# Altium footprint library domino-rising-cage-clamp.PcbLib: 435 footprints (part 28 of 28)
Each footprint in its own frame and in the unit in brackets; x right, y up, seen from the top. Pads: shape width x height; smd on the part's side, far side on the other; paste and mask are expansions set on the pad; w line width, h text height; cw(c..) or ccw(c..) is an arc to the next point about the centre after c.
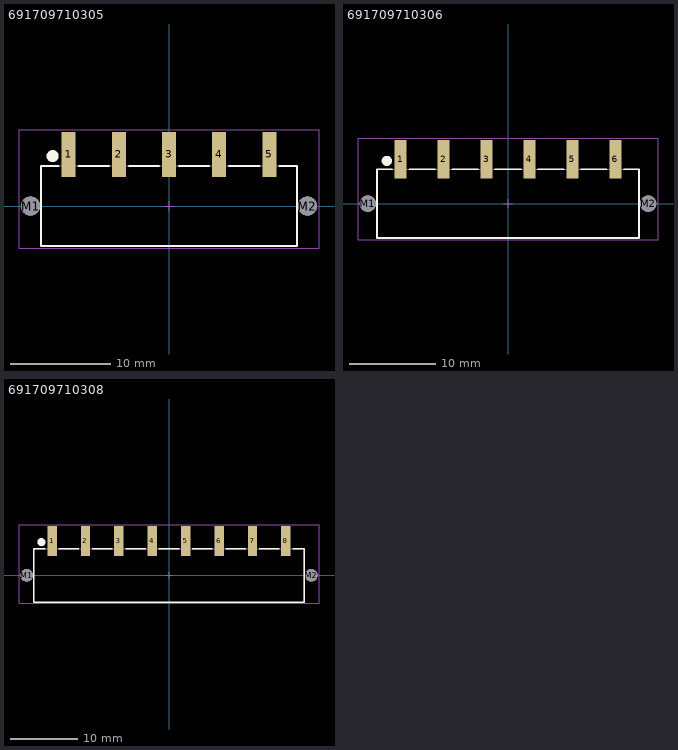
[diagram p27: the footprints below, top view; thin cyan lines are the x and y axes]

## 691709710305 [mm] "Horizontal Entry SMT with Pressure Clamp, pitch 5mm, 05p"
height 10.9
pads (7):
  rect 1.4x4.5 smd: 1(-10,5.15) 2(-5,5.15) 3(0,5.15) 4(5,5.15) 5(10,5.15)
  round 1.9 hole 1.9 unplated: M1(-13.8,0) M2(13.8,0)
Top Overlay:
  circle w0.8: c-11.6,4.975 r0.193
  lines w0.2: -11,4 -12.75,4 -12.75,-4 12.75,-4 12.75,4 11,4 ; -9,4 -6,4 ; -4,4 -1,4 ; 1,4 4,4 ; 6,4 9,4
Mechanical 13:
  lines w0.1: -10.5,4 -10.5,7 -9.5,7 -9.5,4 ; -5.5,4 -5.5,7 -4.5,7 -4.5,4 ; -0.5,4 -0.5,7 0.5,7 0.5,4 ; 4.5,4 4.5,7 5.5,7 5.5,4 ; 9.5,4 9.5,7 10.5,7 10.5,4 ; -12.75,-4 12.75,-4 12.75,4 -12.75,4 -12.75,-4
Mechanical 15:
  lines w0.05: -0.5,0 0.5,0 ; 0,-0.5 0,0.5 ; -14.95,-4.2 14.95,-4.2 14.95,7.6 -14.95,7.6 -14.95,-4.2
3D body "691709710305.stp": height 9.95, standoff -1.75, extent -14.5,-4 14.5,7

## 691709710306 [mm] "Horizontal Entry SMT with Pressure Clamp, pitch 5mm, 06p"
height 10.9
pads (8):
  rect 1.4x4.5 smd: 1(-12.5,5.15) 2(-7.5,5.15) 3(-2.5,5.15) 4(2.5,5.15) 5(7.5,5.15) 6(12.5,5.15)
  round 1.9 hole 1.9 unplated: M1(-16.3,0) M2(16.3,0)
Top Overlay:
  circle w0.8: c-14.1,4.975 r0.193
  lines w0.2: -13.5,4 -15.25,4 -15.25,-4 15.25,-4 15.25,4 13.5,4 ; -11.5,4 -8.5,4 ; -6.5,4 -3.5,4 ; -1.5,4 1.5,4 ; 3.5,4 6.5,4 ; 8.5,4 11.5,4
Mechanical 13:
  lines w0.1: -13,4 -13,7 -12,7 -12,4 ; -8,4 -8,7 -7,7 -7,4 ; -3,4 -3,7 -2,7 -2,4 ; 2,4 2,7 3,7 3,4 ; 7,4 7,7 8,7 8,4 ; 12,4 12,7 13,7 13,4 ; -15.25,-4 -15.25,4 15.25,4 15.25,-4 -15.25,-4
Mechanical 15:
  lines w0.05: -0.5,0 0.5,0 ; 0,-0.5 0,0.5 ; -17.45,-4.2 -17.45,7.6 17.45,7.6 17.45,-4.2 -17.45,-4.2
3D body "691709710306.stp": height 9.95, standoff -1.75, extent -17,-4 17,7

## 691709710308 [mm] "Horizontal Entry SMT with Pressure Clamp, pitch 5mm, 08p"
height 10.9
pads (10):
  rect 1.4x4.5 smd: 1(-17.5,5.15) 2(-12.5,5.15) 3(-7.5,5.15) 4(-2.5,5.15) 5(2.5,5.15) 6(7.5,5.15) 7(12.5,5.15) 8(17.5,5.15)
  round 1.9 hole 1.9 unplated: M1(-21.3,0) M2(21.3,0)
Top Overlay:
  circle w0.8: c-19.1,4.975 r0.193
  lines w0.2: -18.5,4 -20.25,4 -20.25,-4 20.25,-4 20.25,4 18.5,4 ; -16.5,4 -13.5,4 ; -11.5,4 -8.5,4 ; -6.5,4 -3.5,4 ; -1.5,4 1.5,4 ; 3.5,4 6.5,4 ; 8.5,4 11.5,4 ; 13.5,4 16.5,4
Mechanical 13:
  lines w0.1: -18,4 -18,7 -17,7 -17,4 ; -13,4 -13,7 -12,7 -12,4 ; -8,4 -8,7 -7,7 -7,4 ; -3,4 -3,7 -2,7 -2,4 ; 2,4 2,7 3,7 3,4 ; 7,4 7,7 8,7 8,4 ; 12,4 12,7 13,7 13,4 ; 17,4 17,7 18,7 18,4 ; -20.25,-4 -20.25,4 20.25,4 20.25,-4 -20.25,-4
Mechanical 15:
  lines w0.05: -0.5,0 0.5,0 ; 0,-0.5 0,0.5 ; -22.45,-4.2 -22.45,7.6 22.45,7.6 22.45,-4.2 -22.45,-4.2
3D body "691709710308.stp": height 9.95, standoff -1.75, extent -22,-4 22,7